# Altium footprint library TriggersLib.PcbLib: 262 footprints (part 16 of 17)
Each footprint in its own frame and in the unit in brackets; x right, y up, seen from the top. Pads: shape width x height; smd on the part's side, far side on the other; paste and mask are expansions set on the pad; w line width, h text height; cw(c..) or ccw(c..) is an arc to the next point about the centre after c.
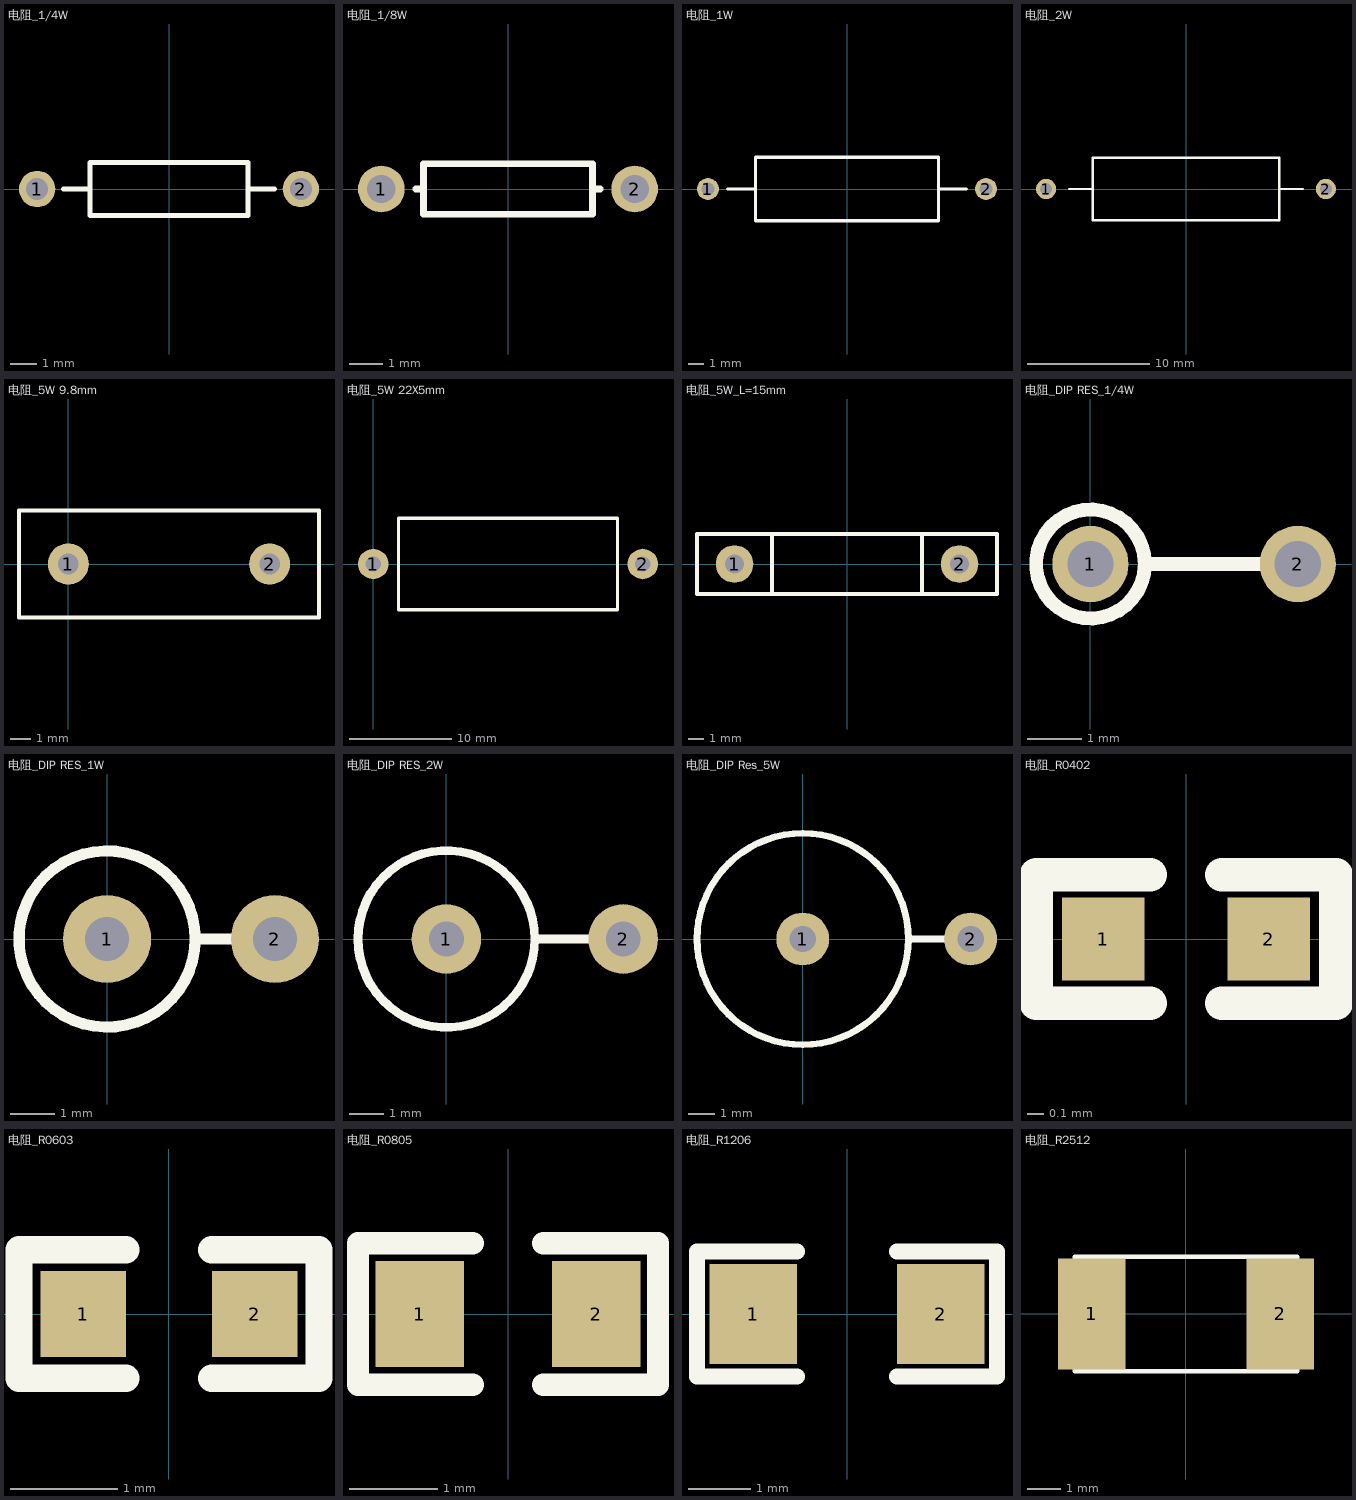
[diagram p15: the footprints below, top view; thin cyan lines are the x and y axes]

## 电阻_1/4W [mm]
height 2.032
pads (2):
  round 1.4 hole 0.85: 1(-5.08,0) 2(5.08,0)
Top Overlay:
  lines w0.2: -4.064,0 -3.048,0 ; 3.048,0 4.064,0 ; -3.048,-1.016 3.048,-1.016 3.048,1.016 -3.048,1.016 -3.048,-1.016

## 电阻_1/8W [mm]
height 1.524
pads (2):
  round 1.4 hole 0.85: 1(-3.81,0) 2(3.81,0)
Top Overlay:
  lines w0.2: -2.769,0 -2.54,0 ; 2.769,0 2.54,0 ; 2.54,0 2.54,0.762 -2.54,0.762 -2.54,-0.762 2.54,-0.762 2.54,0

## 电阻_1W [mm]
height 4.064
pads (2):
  round 1.4 hole 0.85: 1(-8.89,0) 2(8.89,0)
Top Overlay:
  lines w0.2: -7.62,0 -5.842,0 ; 5.842,0 7.62,0 ; -5.842,-2.032 5.842,-2.032 5.842,2.032 -5.842,2.032 -5.842,-2.032

## 电阻_2W [mm]
height 5.08
pads (2):
  round 1.65 hole 1: 1(-11.43,0) 2(11.43,0)
Top Overlay:
  lines w0.2: -9.525,0 -7.62,0 ; 7.62,0 9.525,0 ; -7.62,-2.54 -7.62,2.54 7.62,2.54 7.62,-2.54 -7.62,-2.54

## 电阻_5W 9.8mm [mm]
pads (2):
  round 2 hole 1: 1(0,0) 2(9.8,0)
Top Overlay:
  lines w0.2: -2.4,-2.6 12.2,-2.6 12.2,2.6 -2.4,2.6 -2.4,-2.6

## 电阻_5W 22X5mm [mm]
pads (2):
  round 3 hole 1.5: 1(0,0) 2(26.5,0)
Top Overlay:
  lines w0.3: 2.5,-4.5 24,-4.5 24,4.5 2.5,4.5 2.5,-4.5

## 电阻_5W_L=15mm [mm]
height 4.064
pads (2):
  round 2.5 hole 1.3: 1(-7.5,0) 2(7.5,0)
Top Overlay:
  lines w0.254: -5,-2 -5,2 ; 5,-2 5,2 ; -10,-2 10,-2 10,2 -10,2 -10,-2

## 电阻_DIP RES_1/4W [mm]
height 2.032
pads (2):
  round 1.4 hole 0.85: 1(0,0) 2(3.81,0)
Top Overlay:
  circle w0.254: c0,0 r1
  lines w0.254: 1,0 3.81,0

## 电阻_DIP RES_1W [mm]
pads (2):
  round 2 hole 1: 1(0,0) 2(3.81,0)
Top Overlay:
  circle w0.254: c0,0 r2
  lines w0.254: 2,0 3.81,0

## 电阻_DIP RES_2W [mm]
pads (2):
  round 2 hole 1: 1(0,0) 2(5.08,0)
Top Overlay:
  circle w0.254: c0,0 r2.54
  lines w0.254: 2.54,0 5.08,0

## 电阻_DIP Res_5W [mm]
pads (2):
  round 2 hole 1: 1(0,0) 2(6.35,0)
Top Overlay:
  circle w0.254: c0,0 r4
  lines w0.254: 4,0 6.35,0

## 电阻_R0402 [mm]
pads (2):
  rect 0.5x0.5 smd: 1(-0.5,0) 2(0.5,0)
Top Overlay:
  lines w0.203: -0.216,-0.39 -0.908,-0.39 -0.908,0.39 -0.216,0.39 ; 0.216,-0.39 0.908,-0.39 0.908,0.39 0.216,0.39
3D body "R0402.STEP": height 0.35, standoff 0, extent -0.5,-0.25 0.5,0.25

## 电阻_R0603 [mm]
pads (2):
  rect 0.8x0.8 smd: 1(-0.8,0) 2(0.8,0)
Top Overlay:
  lines w0.254: -0.4,-0.6 -1.4,-0.6 -1.4,0.6 -0.4,0.6 ; 0.4,-0.6 1.4,-0.6 1.4,0.6 0.4,0.6
3D body "R0603.STEP": height 0.45, standoff 0, extent -0.8,-0.4 0.8,0.4

## 电阻_R0805 [mm]
pads (2):
  rect 1x1.2 smd: 1(-1,0) 2(1,0)
Top Overlay:
  lines w0.254: -0.4,-0.8 -1.7,-0.8 -1.7,0.8 -0.4,0.8 ; 0.4,-0.8 1.7,-0.8 1.7,0.8 0.4,0.8
3D body "R0805.STEP": height 0.55, standoff 0, extent -1,-0.63 1,0.63

## 电阻_R1206 [mm]
pads (2):
  rect 1.4x1.6 smd: 1(-1.5,0) 2(1.5,0)
Top Overlay:
  lines w0.254: -0.8,-1 -2.4,-1 -2.4,1 -0.8,1 ; 0.8,-1 2.4,-1 2.4,1 0.8,1
3D body "R1206.STEP": height 0.6, standoff 0, extent -1.6,-0.8 1.6,0.8

## 电阻_R2512 [mm]
pads (2):
  rect 2x3.3 smd: 1(-2.8,0) 2(2.8,0)
Top Overlay:
  lines w0.127: -3.3,-1.7 -3.3,1.7 3.3,1.7 3.3,-1.7 -3.3,-1.7